# Altium integrated library TerminalBlocksPluggable_5.08mm.IntLib: 266 symbols (part 1 of 2) (continued)
## 691312510015
designator J?
WR-TBL Terminal Blocks Serie 312 – 5.08 mm; Manufacturer: Würth Elektronik eiSos GmbH; ComponentLink1 Description: Manufacturer; ComponentLink2 Description: Datasheet; NoPins: 15; Created Date: 31 March 2014; partNo: 691312510015; ComponentLink1URL: http://www.we-online.com; ComponentLink2URL: http://katalog.we-online.de/em/datasheet/6913125100xx.pdf; Created by: Karrer Zheng; Value: 691312510015
footprint 691312510015 (5,08mm - PCB Headers - Horizontal - Opened ends - 15p)
pins: 1, 2, 3, 4, 5, 6, 7, 8, 9, 10, 11, 12, 13, 14, 15

## 691312510016
designator J?
WR-TBL Terminal Blocks Serie 312 – 5.08 mm; Manufacturer: Würth Elektronik eiSos GmbH; ComponentLink1 Description: Manufacturer; ComponentLink2 Description: Datasheet; NoPins: 16; Created Date: 31 March 2014; partNo: 691312510016; ComponentLink1URL: http://www.we-online.com; ComponentLink2URL: http://katalog.we-online.de/em/datasheet/6913125100xx.pdf; Created by: Karrer Zheng; Value: 691312510016
footprint 691312510016 (5,08mm - PCB Headers - Horizontal - Opened ends - 16p)
pins: 1, 2, 3, 4, 5, 6, 7, 8, 9, 10, 11, 12, 13, 14, 15, 16

## 691312510017
designator J?
WR-TBL Terminal Blocks Serie 312 – 5.08 mm; Manufacturer: Würth Elektronik eiSos GmbH; ComponentLink1 Description: Manufacturer; ComponentLink2 Description: Datasheet; NoPins: 17; Created Date: 31 March 2014; partNo: 691312510017; ComponentLink1URL: http://www.we-online.com; ComponentLink2URL: http://katalog.we-online.de/em/datasheet/6913125100xx.pdf; Created by: Karrer Zheng; Value: 691312510017
footprint 691312510017 (5,08mm - PCB Headers - Horizontal - Opened ends - 17p)
pins: 1, 2, 3, 4, 5, 6, 7, 8, 9, 10, 11, 12, 13, 14, 15, 16, 17

## 691312510018
designator J?
WR-TBL Terminal Blocks Serie 312 – 5.08 mm; Manufacturer: Würth Elektronik eiSos GmbH; ComponentLink1 Description: Manufacturer; ComponentLink2 Description: Datasheet; NoPins: 18; Created Date: 31 March 2014; partNo: 691312510018; ComponentLink1URL: http://www.we-online.com; ComponentLink2URL: http://katalog.we-online.de/em/datasheet/6913125100xx.pdf; Created by: Karrer Zheng; Value: 691312510018
footprint 691312510018 (5,08mm - PCB Headers - Horizontal - Opened ends - 18p)
pins: 1, 2, 3, 4, 5, 6, 7, 8, 9, 10, 11, 12, 13, 14, 15, 16, 17, 18

## 691312510019
designator J?
WR-TBL Terminal Blocks Serie 312 – 5.08 mm; Manufacturer: Würth Elektronik eiSos GmbH; ComponentLink1 Description: Manufacturer; ComponentLink2 Description: Datasheet; NoPins: 19; Created Date: 31 March 2014; partNo: 691312510019; ComponentLink1URL: http://www.we-online.com; ComponentLink2URL: http://katalog.we-online.de/em/datasheet/6913125100xx.pdf; Created by: Karrer Zheng; Value: 691312510019
footprint 691312510019 (5,08mm - PCB Headers - Horizontal - Opened ends - 19p)
pins: 1, 2, 3, 4, 5, 6, 7, 8, 9, 10, 11, 12, 13, 14, 15, 16, 17, 18, 19

## 691312510020
designator J?
WR-TBL Terminal Blocks Serie 312 – 5.08 mm; Manufacturer: Würth Elektronik eiSos GmbH; ComponentLink1 Description: Manufacturer; ComponentLink2 Description: Datasheet; NoPins: 20; Created Date: 31 March 2014; partNo: 691312510020; ComponentLink1URL: http://www.we-online.com; ComponentLink2URL: http://katalog.we-online.de/em/datasheet/6913125100xx.pdf; Created by: Karrer Zheng; Value: 691312510020
footprint 691312510020 (5,08mm - PCB Headers - Horizontal - Opened ends - 20p)
pins: 1, 2, 3, 4, 5, 6, 7, 8, 9, 10, 11, 12, 13, 14, 15, 16, 17, 18, 19, 20

## 691312510021
designator J?
WR-TBL Terminal Blocks Serie 312 – 5.08 mm; Manufacturer: Würth Elektronik eiSos GmbH; ComponentLink1 Description: Manufacturer; ComponentLink2 Description: Datasheet; NoPins: 21; Created Date: 31 March 2014; partNo: 691312510021; ComponentLink1URL: http://www.we-online.com; ComponentLink2URL: http://katalog.we-online.de/em/datasheet/6913125100xx.pdf; Created by: Karrer Zheng; Value: 691312510021
footprint 691312510021 (5,08mm - PCB Headers - Horizontal - Opened ends - 21p)
pins: 1, 2, 3, 4, 5, 6, 7, 8, 9, 10, 11, 12, 13, 14, 15, 16, 17, 18, 19, 20, 21

## 691312510022
designator J?
WR-TBL Terminal Blocks Serie 312 – 5.08 mm; Manufacturer: Würth Elektronik eiSos GmbH; ComponentLink1 Description: Manufacturer; ComponentLink2 Description: Datasheet; NoPins: 22; Created Date: 31 March 2014; partNo: 691312510022; ComponentLink1URL: http://www.we-online.com; ComponentLink2URL: http://katalog.we-online.de/em/datasheet/6913125100xx.pdf; Created by: Karrer Zheng; Value: 691312510022
footprint 691312510022 (5,08mm - PCB Headers - Horizontal - Opened ends - 22p)
pins: 1, 2, 3, 4, 5, 6, 7, 8, 9, 10, 11, 12, 13, 14, 15, 16, 17, 18, 19, 20, 21, 22

## 691312510023
designator J?
WR-TBL Terminal Blocks Serie 312 – 5.08 mm; Manufacturer: Würth Elektronik eiSos GmbH; ComponentLink1 Description: Manufacturer; ComponentLink2 Description: Datasheet; NoPins: 23; Created Date: 31 March 2014; partNo: 691312510023; ComponentLink1URL: http://www.we-online.com; ComponentLink2URL: http://katalog.we-online.de/em/datasheet/6913125100xx.pdf; Created by: Karrer Zheng; Value: 691312510023
footprint 691312510023 (5,08mm - PCB Headers - Horizontal - Opened ends - 23p)
pins: 1, 2, 3, 4, 5, 6, 7, 8, 9, 10, 11, 12, 13, 14, 15, 16, 17, 18, 19, 20, 21, 22, 23

## 691312510024
designator J?
WR-TBL Terminal Blocks Serie 312 – 5.08 mm; Manufacturer: Würth Elektronik eiSos GmbH; ComponentLink1 Description: Manufacturer; ComponentLink2 Description: Datasheet; NoPins: 24; Created Date: 31 March 2014; partNo: 691312510024; ComponentLink1URL: http://www.we-online.com; ComponentLink2URL: http://katalog.we-online.de/em/datasheet/6913125100xx.pdf; Created by: Karrer Zheng; Value: 691312510024
footprint 691312510024 (5,08mm - PCB Headers - Horizontal - Opened ends - 24p)
pins: 1, 2, 3, 4, 5, 6, 7, 8, 9, 10, 11, 12, 13, 14, 15, 16, 17, 18, 19, 20, 21, 22, 23, 24


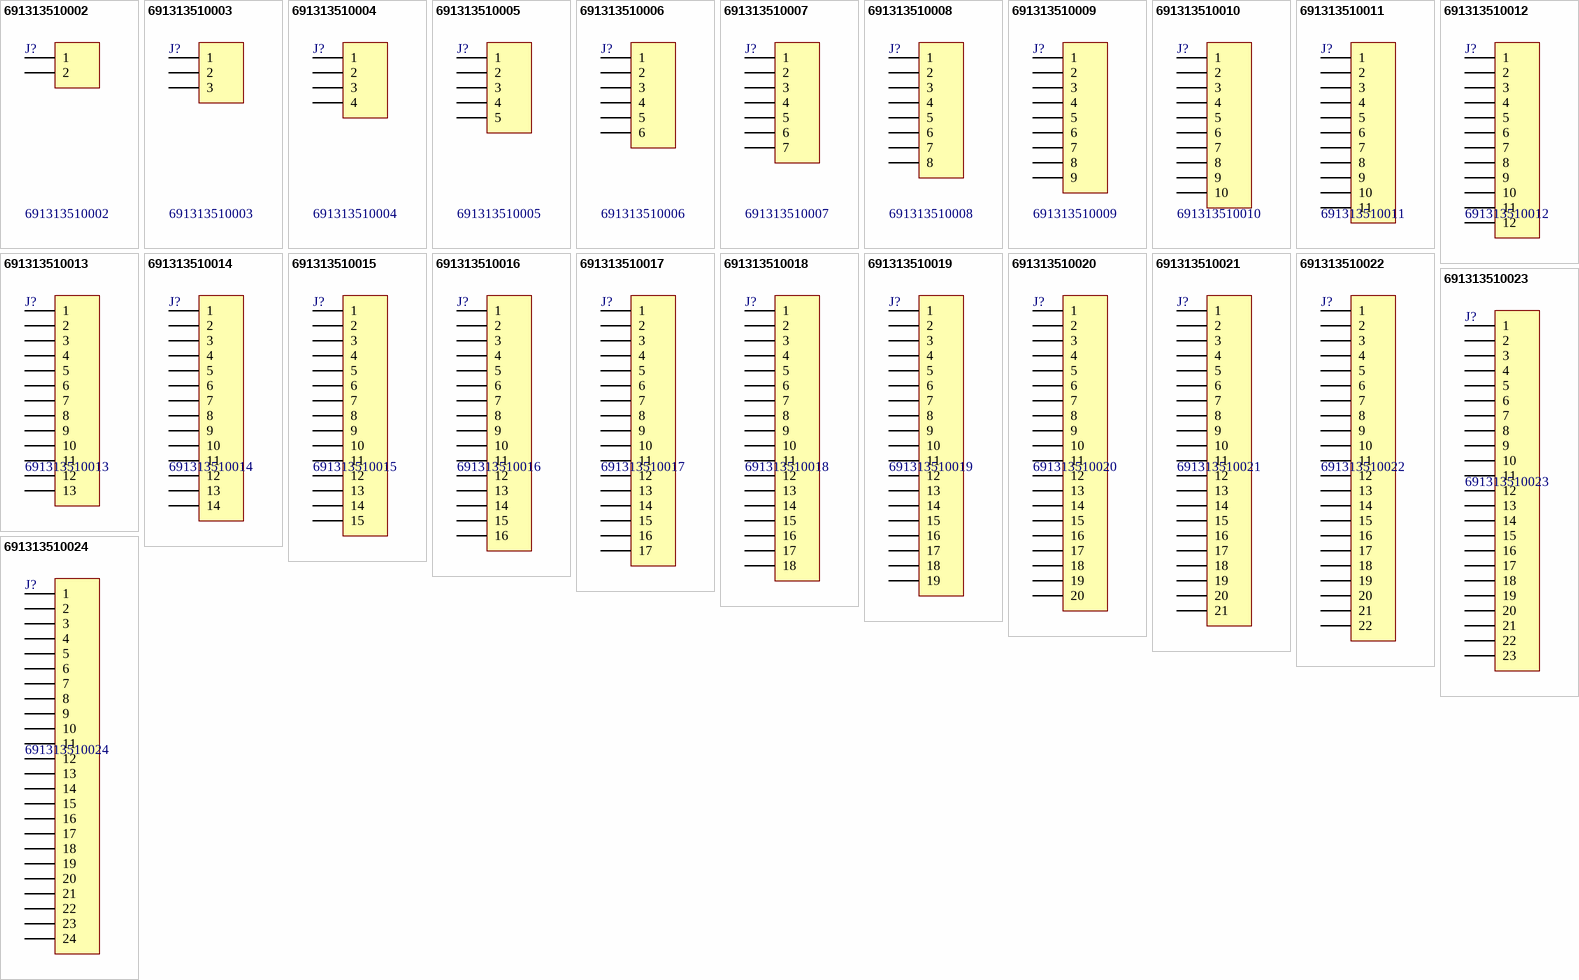
[diagram p5: symbols 691313510002 to 691313510024]

## 691313510002
designator J?
WR-TBL Terminal Blocks Serie 313 – 5.08 mm; Manufacturer: Würth Elektronik eiSos GmbH; ComponentLink1 Description: Manufacturer; ComponentLink2 Description: Datasheet; NoPins: 02; Created Date: 31 March 2014; partNo: 691313510002; ComponentLink1URL: http://www.we-online.com; ComponentLink2URL: http://katalog.we-online.de/em/datasheet/6913135100xx.pdf; Created by: Karrer Zheng; Value: 691313510002
footprint 691313510002 (5,08mm - PCB Headers - Horizontal - Closed ends - 02p)
pins: 1, 2

## 691313510003
designator J?
WR-TBL Terminal Blocks Serie 313 – 5.08 mm; Manufacturer: Würth Elektronik eiSos GmbH; ComponentLink1 Description: Manufacturer; ComponentLink2 Description: Datasheet; NoPins: 03; Created Date: 31 March 2014; partNo: 691313510003; ComponentLink1URL: http://www.we-online.com; ComponentLink2URL: http://katalog.we-online.de/em/datasheet/6913135100xx.pdf; Created by: Karrer Zheng; Value: 691313510003
footprint 691313510003 (5,08mm - PCB Headers - Horizontal - Closed ends - 03p)
pins: 1, 2, 3

## 691313510004
designator J?
WR-TBL Terminal Blocks Serie 313 – 5.08 mm; Manufacturer: Würth Elektronik eiSos GmbH; ComponentLink1 Description: Manufacturer; ComponentLink2 Description: Datasheet; NoPins: 04; Created Date: 31 March 2014; partNo: 691313510004; ComponentLink1URL: http://www.we-online.com; ComponentLink2URL: http://katalog.we-online.de/em/datasheet/6913135100xx.pdf; Created by: Karrer Zheng; Value: 691313510004
footprint 691313510004 (5,08mm - PCB Headers - Horizontal - Closed ends - 04p)
pins: 1, 2, 3, 4

## 691313510005
designator J?
WR-TBL Terminal Blocks Serie 313 – 5.08 mm; Manufacturer: Würth Elektronik eiSos GmbH; ComponentLink1 Description: Manufacturer; ComponentLink2 Description: Datasheet; NoPins: 05; Created Date: 31 March 2014; partNo: 691313510005; ComponentLink1URL: http://www.we-online.com; ComponentLink2URL: http://katalog.we-online.de/em/datasheet/6913135100xx.pdf; Created by: Karrer Zheng; Value: 691313510005
footprint 691313510005 (5,08mm - PCB Headers - Horizontal - Closed ends - 05p)
pins: 1, 2, 3, 4, 5

## 691313510006
designator J?
WR-TBL Terminal Blocks Serie 313 – 5.08 mm; Manufacturer: Würth Elektronik eiSos GmbH; ComponentLink1 Description: Manufacturer; ComponentLink2 Description: Datasheet; NoPins: 06; Created Date: 31 March 2014; partNo: 691313510006; ComponentLink1URL: http://www.we-online.com; ComponentLink2URL: http://katalog.we-online.de/em/datasheet/6913135100xx.pdf; Created by: Karrer Zheng; Value: 691313510006
footprint 691313510006 (5,08mm - PCB Headers - Horizontal - Closed ends - 06p)
pins: 1, 2, 3, 4, 5, 6

## 691313510007
designator J?
WR-TBL Terminal Blocks Serie 313 – 5.08 mm; Manufacturer: Würth Elektronik eiSos GmbH; ComponentLink1 Description: Manufacturer; ComponentLink2 Description: Datasheet; NoPins: 07; Created Date: 31 March 2014; partNo: 691313510007; ComponentLink1URL: http://www.we-online.com; ComponentLink2URL: http://katalog.we-online.de/em/datasheet/6913135100xx.pdf; Created by: Karrer Zheng; Value: 691313510007
footprint 691313510007 (5,08mm - PCB Headers - Horizontal - Closed ends - 07p)
pins: 1, 2, 3, 4, 5, 6, 7

## 691313510008
designator J?
WR-TBL Terminal Blocks Serie 313 – 5.08 mm; Manufacturer: Würth Elektronik eiSos GmbH; ComponentLink1 Description: Manufacturer; ComponentLink2 Description: Datasheet; NoPins: 08; Created Date: 31 March 2014; partNo: 691313510008; ComponentLink1URL: http://www.we-online.com; ComponentLink2URL: http://katalog.we-online.de/em/datasheet/6913135100xx.pdf; Created by: Karrer Zheng; Value: 691313510008
footprint 691313510008 (5,08mm - PCB Headers - Horizontal - Closed ends - 08p)
pins: 1, 2, 3, 4, 5, 6, 7, 8

## 691313510009
designator J?
WR-TBL Terminal Blocks Serie 313 – 5.08 mm; Manufacturer: Würth Elektronik eiSos GmbH; ComponentLink1 Description: Manufacturer; ComponentLink2 Description: Datasheet; NoPins: 09; Created Date: 31 March 2014; partNo: 691313510009; ComponentLink1URL: http://www.we-online.com; ComponentLink2URL: http://katalog.we-online.de/em/datasheet/6913135100xx.pdf; Created by: Karrer Zheng; Value: 691313510009
footprint 691313510009 (5,08mm - PCB Headers - Horizontal - Closed ends - 09p)
pins: 1, 2, 3, 4, 5, 6, 7, 8, 9

## 691313510010
designator J?
WR-TBL Terminal Blocks Serie 313 – 5.08 mm; Manufacturer: Würth Elektronik eiSos GmbH; ComponentLink1 Description: Manufacturer; ComponentLink2 Description: Datasheet; NoPins: 10; Created Date: 31 March 2014; partNo: 691313510010; ComponentLink1URL: http://www.we-online.com; ComponentLink2URL: http://katalog.we-online.de/em/datasheet/6913135100xx.pdf; Created by: Karrer Zheng; Value: 691313510010
footprint 691313510010 (5,08mm - PCB Headers - Horizontal - Closed ends - 10p)
pins: 1, 2, 3, 4, 5, 6, 7, 8, 9, 10

## 691313510011
designator J?
WR-TBL Terminal Blocks Serie 313 – 5.08 mm; Manufacturer: Würth Elektronik eiSos GmbH; ComponentLink1 Description: Manufacturer; ComponentLink2 Description: Datasheet; NoPins: 11; Created Date: 31 March 2014; partNo: 691313510011; ComponentLink1URL: http://www.we-online.com; ComponentLink2URL: http://katalog.we-online.de/em/datasheet/6913135100xx.pdf; Created by: Karrer Zheng; Value: 691313510011
footprint 691313510011 (5,08mm - PCB Headers - Horizontal - Closed ends - 11p)
pins: 1, 2, 3, 4, 5, 6, 7, 8, 9, 10, 11

## 691313510012
designator J?
WR-TBL Terminal Blocks Serie 313 – 5.08 mm; Manufacturer: Würth Elektronik eiSos GmbH; ComponentLink1 Description: Manufacturer; ComponentLink2 Description: Datasheet; NoPins: 12; Created Date: 31 March 2014; partNo: 691313510012; ComponentLink1URL: http://www.we-online.com; ComponentLink2URL: http://katalog.we-online.de/em/datasheet/6913135100xx.pdf; Created by: Karrer Zheng; Value: 691313510012
footprint 691313510012 (5,08mm - PCB Headers - Horizontal - Closed ends - 12p)
pins: 1, 2, 3, 4, 5, 6, 7, 8, 9, 10, 11, 12

## 691313510013
designator J?
WR-TBL Terminal Blocks Serie 313 – 5.08 mm; Manufacturer: Würth Elektronik eiSos GmbH; ComponentLink1 Description: Manufacturer; ComponentLink2 Description: Datasheet; NoPins: 13; Created Date: 31 March 2014; partNo: 691313510013; ComponentLink1URL: http://www.we-online.com; ComponentLink2URL: http://katalog.we-online.de/em/datasheet/6913135100xx.pdf; Created by: Karrer Zheng; Value: 691313510013
footprint 691313510013 (5,08mm - PCB Headers - Horizontal - Closed ends - 13p)
pins: 1, 2, 3, 4, 5, 6, 7, 8, 9, 10, 11, 12, 13

## 691313510014
designator J?
WR-TBL Terminal Blocks Serie 313 – 5.08 mm; Manufacturer: Würth Elektronik eiSos GmbH; ComponentLink1 Description: Manufacturer; ComponentLink2 Description: Datasheet; NoPins: 14; Created Date: 31 March 2014; partNo: 691313510014; ComponentLink1URL: http://www.we-online.com; ComponentLink2URL: http://katalog.we-online.de/em/datasheet/6913135100xx.pdf; Created by: Karrer Zheng; Value: 691313510014
footprint 691313510014 (5,08mm - PCB Headers - Horizontal - Closed ends - 14p)
pins: 1, 2, 3, 4, 5, 6, 7, 8, 9, 10, 11, 12, 13, 14

## 691313510015
designator J?
WR-TBL Terminal Blocks Serie 313 – 5.08 mm; Manufacturer: Würth Elektronik eiSos GmbH; ComponentLink1 Description: Manufacturer; ComponentLink2 Description: Datasheet; NoPins: 15; Created Date: 31 March 2014; partNo: 691313510015; ComponentLink1URL: http://www.we-online.com; ComponentLink2URL: http://katalog.we-online.de/em/datasheet/6913135100xx.pdf; Created by: Karrer Zheng; Value: 691313510015
footprint 691313510015 (5,08mm - PCB Headers - Horizontal - Closed ends - 15p)
pins: 1, 2, 3, 4, 5, 6, 7, 8, 9, 10, 11, 12, 13, 14, 15

## 691313510016
designator J?
WR-TBL Terminal Blocks Serie 313 – 5.08 mm; Manufacturer: Würth Elektronik eiSos GmbH; ComponentLink1 Description: Manufacturer; ComponentLink2 Description: Datasheet; NoPins: 16; Created Date: 31 March 2014; partNo: 691313510016; ComponentLink1URL: http://www.we-online.com; ComponentLink2URL: http://katalog.we-online.de/em/datasheet/6913135100xx.pdf; Created by: Karrer Zheng; Value: 691313510016
footprint 691313510016 (5,08mm - PCB Headers - Horizontal - Closed ends - 16p)
pins: 1, 2, 3, 4, 5, 6, 7, 8, 9, 10, 11, 12, 13, 14, 15, 16

## 691313510017
designator J?
WR-TBL Terminal Blocks Serie 313 – 5.08 mm; Manufacturer: Würth Elektronik eiSos GmbH; ComponentLink1 Description: Manufacturer; ComponentLink2 Description: Datasheet; NoPins: 17; Created Date: 31 March 2014; partNo: 691313510017; ComponentLink1URL: http://www.we-online.com; ComponentLink2URL: http://katalog.we-online.de/em/datasheet/6913135100xx.pdf; Created by: Karrer Zheng; Value: 691313510017
footprint 691313510017 (5,08mm - PCB Headers - Horizontal - Closed ends - 17p)
pins: 1, 2, 3, 4, 5, 6, 7, 8, 9, 10, 11, 12, 13, 14, 15, 16, 17

## 691313510018
designator J?
WR-TBL Terminal Blocks Serie 313 – 5.08 mm; Manufacturer: Würth Elektronik eiSos GmbH; ComponentLink1 Description: Manufacturer; ComponentLink2 Description: Datasheet; NoPins: 18; Created Date: 31 March 2014; partNo: 691313510018; ComponentLink1URL: http://www.we-online.com; ComponentLink2URL: http://katalog.we-online.de/em/datasheet/6913135100xx.pdf; Created by: Karrer Zheng; Value: 691313510018
footprint 691313510018 (5,08mm - PCB Headers - Horizontal - Closed ends - 18p)
pins: 1, 2, 3, 4, 5, 6, 7, 8, 9, 10, 11, 12, 13, 14, 15, 16, 17, 18

## 691313510019
designator J?
WR-TBL Terminal Blocks Serie 313 – 5.08 mm; Manufacturer: Würth Elektronik eiSos GmbH; ComponentLink1 Description: Manufacturer; ComponentLink2 Description: Datasheet; NoPins: 19; Created Date: 31 March 2014; partNo: 691313510019; ComponentLink1URL: http://www.we-online.com; ComponentLink2URL: http://katalog.we-online.de/em/datasheet/6913135100xx.pdf; Created by: Karrer Zheng; Value: 691313510019
footprint 691313510019 (5,08mm - PCB Headers - Horizontal - Closed ends - 19p)
pins: 1, 2, 3, 4, 5, 6, 7, 8, 9, 10, 11, 12, 13, 14, 15, 16, 17, 18, 19

## 691313510020
designator J?
WR-TBL Terminal Blocks Serie 313 – 5.08 mm; Manufacturer: Würth Elektronik eiSos GmbH; ComponentLink1 Description: Manufacturer; ComponentLink2 Description: Datasheet; NoPins: 20; Created Date: 31 March 2014; partNo: 691313510020; ComponentLink1URL: http://www.we-online.com; ComponentLink2URL: http://katalog.we-online.de/em/datasheet/6913135100xx.pdf; Created by: Karrer Zheng; Value: 691313510020
footprint 691313510020 (5,08mm - PCB Headers - Horizontal - Closed ends - 20p)
pins: 1, 2, 3, 4, 5, 6, 7, 8, 9, 10, 11, 12, 13, 14, 15, 16, 17, 18, 19, 20

## 691313510021
designator J?
WR-TBL Terminal Blocks Serie 313 – 5.08 mm; Manufacturer: Würth Elektronik eiSos GmbH; ComponentLink1 Description: Manufacturer; ComponentLink2 Description: Datasheet; NoPins: 21; Created Date: 31 March 2014; partNo: 691313510021; ComponentLink1URL: http://www.we-online.com; ComponentLink2URL: http://katalog.we-online.de/em/datasheet/6913135100xx.pdf; Created by: Karrer Zheng; Value: 691313510021
footprint 691313510021 (5,08mm - PCB Headers - Horizontal - Closed ends - 21p)
pins: 1, 2, 3, 4, 5, 6, 7, 8, 9, 10, 11, 12, 13, 14, 15, 16, 17, 18, 19, 20, 21

## 691313510022
designator J?
WR-TBL Terminal Blocks Serie 313 – 5.08 mm; Manufacturer: Würth Elektronik eiSos GmbH; ComponentLink1 Description: Manufacturer; ComponentLink2 Description: Datasheet; NoPins: 22; Created Date: 31 March 2014; partNo: 691313510022; ComponentLink1URL: http://www.we-online.com; ComponentLink2URL: http://katalog.we-online.de/em/datasheet/6913135100xx.pdf; Created by: Karrer Zheng; Value: 691313510022
footprint 691313510022 (5,08mm - PCB Headers - Horizontal - Closed ends - 22p)
pins: 1, 2, 3, 4, 5, 6, 7, 8, 9, 10, 11, 12, 13, 14, 15, 16, 17, 18, 19, 20, 21, 22

## 691313510023
designator J?
WR-TBL Terminal Blocks Serie 313 – 5.08 mm; Manufacturer: Würth Elektronik eiSos GmbH; ComponentLink1 Description: Manufacturer; ComponentLink2 Description: Datasheet; NoPins: 23; Created Date: 31 March 2014; partNo: 691313510023; ComponentLink1URL: http://www.we-online.com; ComponentLink2URL: http://katalog.we-online.de/em/datasheet/6913135100xx.pdf; Created by: Karrer Zheng; Value: 691313510023
footprint 691313510023 (5,08mm - PCB Headers - Horizontal - Closed ends -23p)
pins: 1, 2, 3, 4, 5, 6, 7, 8, 9, 10, 11, 12, 13, 14, 15, 16, 17, 18, 19, 20, 21, 22, 23

## 691313510024
designator J?
WR-TBL Terminal Blocks Serie 313 – 5.08 mm; Manufacturer: Würth Elektronik eiSos GmbH; ComponentLink1 Description: Manufacturer; ComponentLink2 Description: Datasheet; NoPins: 24; Created Date: 31 March 2014; partNo: 691313510024; ComponentLink1URL: http://www.we-online.com; ComponentLink2URL: http://katalog.we-online.de/em/datasheet/6913135100xx.pdf; Created by: Karrer Zheng; Value: 691313510024
footprint 691313510024 (5,08mm - PCB Headers - Horizontal - Closed ends - 24p)
pins: 1, 2, 3, 4, 5, 6, 7, 8, 9, 10, 11, 12, 13, 14, 15, 16, 17, 18, 19, 20, 21, 22, 23, 24


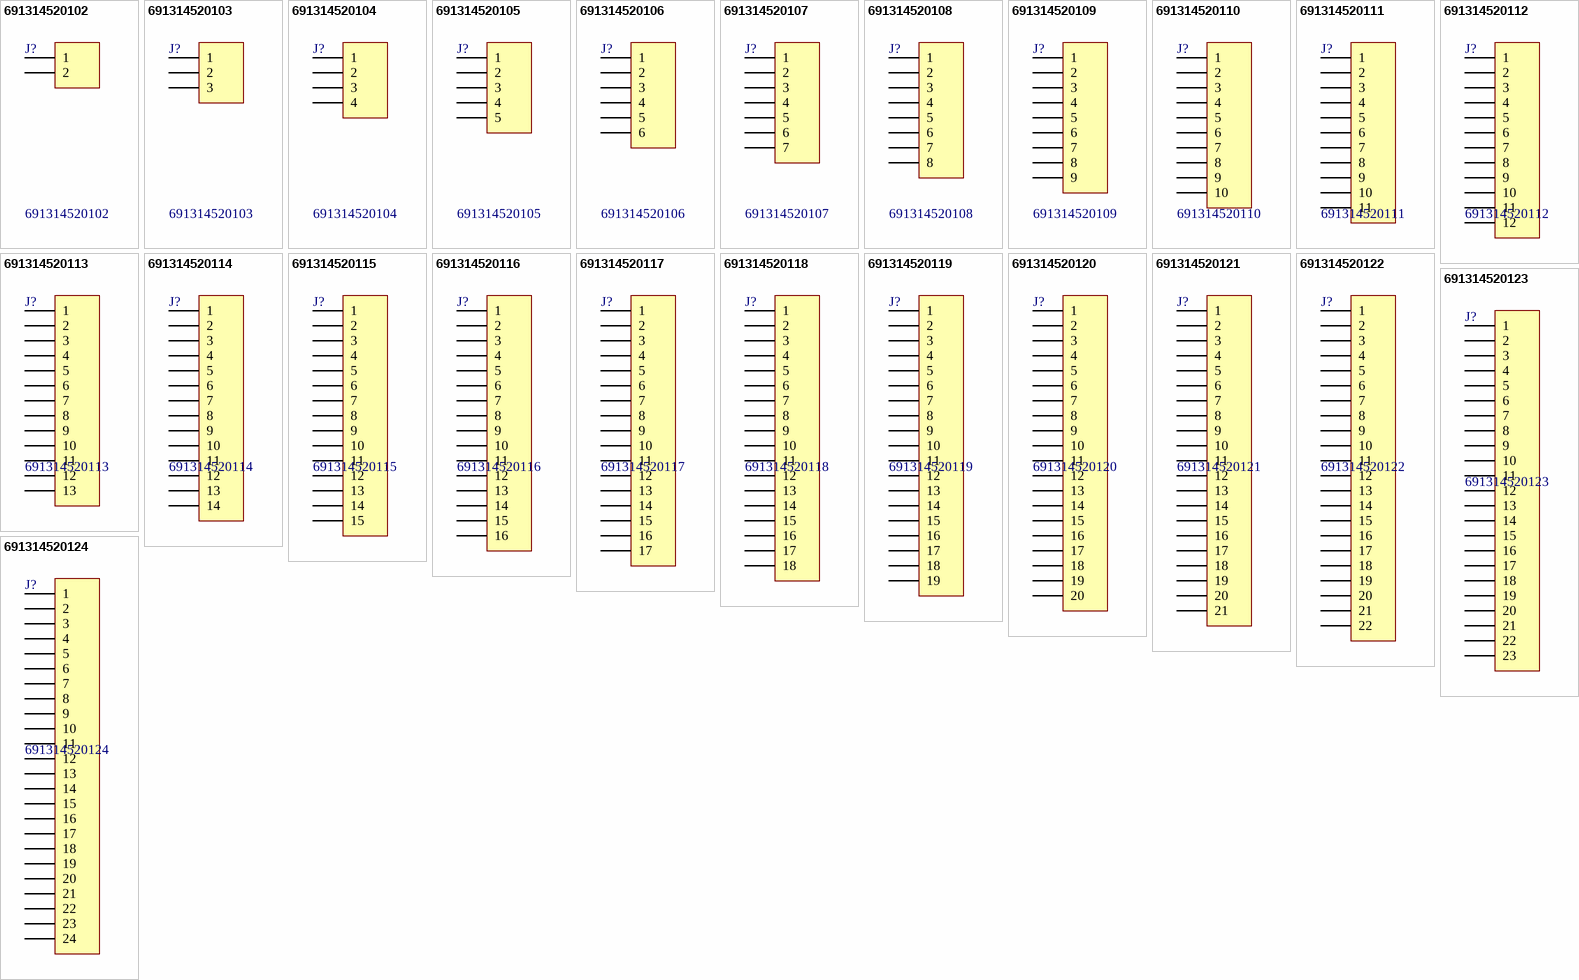
[diagram p6: symbols 691314520102 to 691314520124]

## 691314520102
designator J?
WR-TBL Terminal Blocks Serie 314 – 5.08 mm; Manufacturer: Würth Elektronik eiSos GmbH; ComponentLink1 Description: Manufacturer; ComponentLink2 Description: Datasheet; NoPins: 02; Created Date: 09 April 2014; partNo: 691314520102; ComponentLink1URL: http://www.we-online.com; ComponentLink2URL: http://katalog.we-online.de/em/datasheet/6913145201xx.pdf; Created by: Karrer Zheng; Value: 691314520102
footprint 691314520102 (5,08mm - PCB Headers - 45°- 02p)
pins: 1, 2

## 691314520103
designator J?
WR-TBL Terminal Blocks Serie 314 – 5.08 mm; Manufacturer: Würth Elektronik eiSos GmbH; ComponentLink1 Description: Manufacturer; ComponentLink2 Description: Datasheet; NoPins: 03; Created Date: 09 April 2014; partNo: 691314520103; ComponentLink1URL: http://www.we-online.com; ComponentLink2URL: http://katalog.we-online.de/em/datasheet/6913145201xx.pdf; Created by: Karrer Zheng; Value: 691314520103
footprint 691314520103 (5,08mm - PCB Headers - 45°- 03p)
pins: 1, 2, 3

## 691314520104
designator J?
WR-TBL Terminal Blocks Serie 314 – 5.08 mm; Manufacturer: Würth Elektronik eiSos GmbH; ComponentLink1 Description: Manufacturer; ComponentLink2 Description: Datasheet; NoPins: 04; Created Date: 09 April 2014; partNo: 691314520104; ComponentLink1URL: http://www.we-online.com; ComponentLink2URL: http://katalog.we-online.de/em/datasheet/6913145201xx.pdf; Created by: Karrer Zheng; Value: 691314520104
footprint 691314520104 (5,08mm - PCB Headers - 45°- 04p)
pins: 1, 2, 3, 4

## 691314520105
designator J?
WR-TBL Terminal Blocks Serie 314 – 5.08 mm; Manufacturer: Würth Elektronik eiSos GmbH; ComponentLink1 Description: Manufacturer; ComponentLink2 Description: Datasheet; NoPins: 05; Created Date: 09 April 2014; partNo: 691314520105; ComponentLink1URL: http://www.we-online.com; ComponentLink2URL: http://katalog.we-online.de/em/datasheet/6913145201xx.pdf; Created by: Karrer Zheng; Value: 691314520105
footprint 691314520105 (5,08mm - PCB Headers - 45°- 05p)
pins: 1, 2, 3, 4, 5

## 691314520106
designator J?
WR-TBL Terminal Blocks Serie 314 – 5.08 mm; Manufacturer: Würth Elektronik eiSos GmbH; ComponentLink1 Description: Manufacturer; ComponentLink2 Description: Datasheet; NoPins: 06; Created Date: 09 April 2014; partNo: 691314520106; ComponentLink1URL: http://www.we-online.com; ComponentLink2URL: http://katalog.we-online.de/em/datasheet/6913145201xx.pdf; Created by: Karrer Zheng; Value: 691314520106
footprint 691314520106 (5,08mm - PCB Headers - 45°- 06p)
pins: 1, 2, 3, 4, 5, 6

## 691314520107
designator J?
WR-TBL Terminal Blocks Serie 314 – 5.08 mm; Manufacturer: Würth Elektronik eiSos GmbH; ComponentLink1 Description: Manufacturer; ComponentLink2 Description: Datasheet; NoPins: 07; Created Date: 09 April 2014; partNo: 691314520107; ComponentLink1URL: http://www.we-online.com; ComponentLink2URL: http://katalog.we-online.de/em/datasheet/6913145201xx.pdf; Created by: Karrer Zheng; Value: 691314520107
footprint 691314520107 (5,08mm - PCB Headers - 45°- 07p)
pins: 1, 2, 3, 4, 5, 6, 7

## 691314520108
designator J?
WR-TBL Terminal Blocks Serie 314 – 5.08 mm; Manufacturer: Würth Elektronik eiSos GmbH; ComponentLink1 Description: Manufacturer; ComponentLink2 Description: Datasheet; NoPins: 08; Created Date: 09 April 2014; partNo: 691314520108; ComponentLink1URL: http://www.we-online.com; ComponentLink2URL: http://katalog.we-online.de/em/datasheet/6913145201xx.pdf; Created by: Karrer Zheng; Value: 691314520108
footprint 691314520108 (5,08mm - PCB Headers - 45°- 08p)
pins: 1, 2, 3, 4, 5, 6, 7, 8

## 691314520109
designator J?
WR-TBL Terminal Blocks Serie 314 – 5.08 mm; Manufacturer: Würth Elektronik eiSos GmbH; ComponentLink1 Description: Manufacturer; ComponentLink2 Description: Datasheet; NoPins: 09; Created Date: 09 April 2014; partNo: 691314520109; ComponentLink1URL: http://www.we-online.com; ComponentLink2URL: http://katalog.we-online.de/em/datasheet/6913145201xx.pdf; Created by: Karrer Zheng; Value: 691314520109
footprint 691314520109 (5,08mm - PCB Headers - 45°- 09p)
pins: 1, 2, 3, 4, 5, 6, 7, 8, 9

## 691314520110
designator J?
WR-TBL Terminal Blocks Serie 314 – 5.08 mm; Manufacturer: Würth Elektronik eiSos GmbH; ComponentLink1 Description: Manufacturer; ComponentLink2 Description: Datasheet; NoPins: 10; Created Date: 09 April 2014; partNo: 691314520110; ComponentLink1URL: http://www.we-online.com; ComponentLink2URL: http://katalog.we-online.de/em/datasheet/6913145201xx.pdf; Created by: Karrer Zheng; Value: 691314520110
footprint 691314520110 (5,08mm - PCB Headers - 45°- 10p)
pins: 1, 2, 3, 4, 5, 6, 7, 8, 9, 10

## 691314520111
designator J?
WR-TBL Terminal Blocks Serie 314 – 5.08 mm; Manufacturer: Würth Elektronik eiSos GmbH; ComponentLink1 Description: Manufacturer; ComponentLink2 Description: Datasheet; NoPins: 11; Created Date: 09 April 2014; partNo: 691314520111; ComponentLink1URL: http://www.we-online.com; ComponentLink2URL: http://katalog.we-online.de/em/datasheet/6913145201xx.pdf; Created by: Karrer Zheng; Value: 691314520111
footprint 691314520111 (5,08mm - PCB Headers - 45°- 11p)
pins: 1, 2, 3, 4, 5, 6, 7, 8, 9, 10, 11

## 691314520112
designator J?
WR-TBL Terminal Blocks Serie 314 – 5.08 mm; Manufacturer: Würth Elektronik eiSos GmbH; ComponentLink1 Description: Manufacturer; ComponentLink2 Description: Datasheet; NoPins: 12; Created Date: 09 April 2014; partNo: 691314520112; ComponentLink1URL: http://www.we-online.com; ComponentLink2URL: http://katalog.we-online.de/em/datasheet/6913145201xx.pdf; Created by: Karrer Zheng; Value: 691314520112
footprint 691314520112 (5,08mm - PCB Headers - 45°- 12p)
pins: 1, 2, 3, 4, 5, 6, 7, 8, 9, 10, 11, 12

## 691314520113
designator J?
WR-TBL Terminal Blocks Serie 314 – 5.08 mm; Manufacturer: Würth Elektronik eiSos GmbH; ComponentLink1 Description: Manufacturer; ComponentLink2 Description: Datasheet; NoPins: 13; Created Date: 09 April 2014; partNo: 691314520113; ComponentLink1URL: http://www.we-online.com; ComponentLink2URL: http://katalog.we-online.de/em/datasheet/6913145201xx.pdf; Created by: Karrer Zheng; Value: 691314520113
footprint 691314520113 (5,08mm - PCB Headers - 45°- 13p)
pins: 1, 2, 3, 4, 5, 6, 7, 8, 9, 10, 11, 12, 13

## 691314520114
designator J?
WR-TBL Terminal Blocks Serie 314 – 5.08 mm; Manufacturer: Würth Elektronik eiSos GmbH; ComponentLink1 Description: Manufacturer; ComponentLink2 Description: Datasheet; NoPins: 14; Created Date: 09 April 2014; partNo: 691314520114; ComponentLink1URL: http://www.we-online.com; ComponentLink2URL: http://katalog.we-online.de/em/datasheet/6913145201xx.pdf; Created by: Karrer Zheng; Value: 691314520114
footprint 691314520114 (5,08mm - PCB Headers - 45°- 14p)
pins: 1, 2, 3, 4, 5, 6, 7, 8, 9, 10, 11, 12, 13, 14

## 691314520115
designator J?
WR-TBL Terminal Blocks Serie 314 – 5.08 mm; Manufacturer: Würth Elektronik eiSos GmbH; ComponentLink1 Description: Manufacturer; ComponentLink2 Description: Datasheet; NoPins: 15; Created Date: 09 April 2014; partNo: 691314520115; ComponentLink1URL: http://www.we-online.com; ComponentLink2URL: http://katalog.we-online.de/em/datasheet/6913145201xx.pdf; Created by: Karrer Zheng; Value: 691314520115
footprint 691314520115 (5,08mm - PCB Headers - 45°- 15p)
pins: 1, 2, 3, 4, 5, 6, 7, 8, 9, 10, 11, 12, 13, 14, 15

## 691314520116
designator J?
WR-TBL Terminal Blocks Serie 314 – 5.08 mm; Manufacturer: Würth Elektronik eiSos GmbH; ComponentLink1 Description: Manufacturer; ComponentLink2 Description: Datasheet; NoPins: 16; Created Date: 09 April 2014; partNo: 691314520116; ComponentLink1URL: http://www.we-online.com; ComponentLink2URL: http://katalog.we-online.de/em/datasheet/6913145201xx.pdf; Created by: Karrer Zheng; Value: 691314520116
footprint 691314520116 (5,08mm - PCB Headers - 45°- 16p)
pins: 1, 2, 3, 4, 5, 6, 7, 8, 9, 10, 11, 12, 13, 14, 15, 16

## 691314520117
designator J?
WR-TBL Terminal Blocks Serie 314 – 5.08 mm; Manufacturer: Würth Elektronik eiSos GmbH; ComponentLink1 Description: Manufacturer; ComponentLink2 Description: Datasheet; NoPins: 17; Created Date: 09 April 2014; partNo: 691314520117; ComponentLink1URL: http://www.we-online.com; ComponentLink2URL: http://katalog.we-online.de/em/datasheet/6913145201xx.pdf; Created by: Karrer Zheng; Value: 691314520117
footprint 691314520117 (5,08mm - PCB Headers - 45°- 17p)
pins: 1, 2, 3, 4, 5, 6, 7, 8, 9, 10, 11, 12, 13, 14, 15, 16, 17

## 691314520118
designator J?
WR-TBL Terminal Blocks Serie 314 – 5.08 mm; Manufacturer: Würth Elektronik eiSos GmbH; ComponentLink1 Description: Manufacturer; ComponentLink2 Description: Datasheet; NoPins: 18; Created Date: 09 April 2014; partNo: 691314520118; ComponentLink1URL: http://www.we-online.com; ComponentLink2URL: http://katalog.we-online.de/em/datasheet/6913145201xx.pdf; Created by: Karrer Zheng; Value: 691314520118
footprint 691314520118 (5,08mm - PCB Headers - 45°- 18p)
pins: 1, 2, 3, 4, 5, 6, 7, 8, 9, 10, 11, 12, 13, 14, 15, 16, 17, 18

## 691314520119
designator J?
WR-TBL Terminal Blocks Serie 314 – 5.08 mm; Manufacturer: Würth Elektronik eiSos GmbH; ComponentLink1 Description: Manufacturer; ComponentLink2 Description: Datasheet; NoPins: 19; Created Date: 09 April 2014; partNo: 691314520119; ComponentLink1URL: http://www.we-online.com; ComponentLink2URL: http://katalog.we-online.de/em/datasheet/6913145201xx.pdf; Created by: Karrer Zheng; Value: 691314520119
footprint 691314520119 (5,08mm - PCB Headers - 45°- 19p)
pins: 1, 2, 3, 4, 5, 6, 7, 8, 9, 10, 11, 12, 13, 14, 15, 16, 17, 18, 19

## 691314520120
designator J?
WR-TBL Terminal Blocks Serie 314 – 5.08 mm; Manufacturer: Würth Elektronik eiSos GmbH; ComponentLink1 Description: Manufacturer; ComponentLink2 Description: Datasheet; NoPins: 20; Created Date: 09 April 2014; partNo: 691314520120; ComponentLink1URL: http://www.we-online.com; ComponentLink2URL: http://katalog.we-online.de/em/datasheet/6913145201xx.pdf; Created by: Karrer Zheng; Value: 691314520120
footprint 691314520120 (5,08mm - PCB Headers - 45°- 20p)
pins: 1, 2, 3, 4, 5, 6, 7, 8, 9, 10, 11, 12, 13, 14, 15, 16, 17, 18, 19, 20

## 691314520121
designator J?
WR-TBL Terminal Blocks Serie 314 – 5.08 mm; Manufacturer: Würth Elektronik eiSos GmbH; ComponentLink1 Description: Manufacturer; ComponentLink2 Description: Datasheet; NoPins: 21; Created Date: 09 April 2014; partNo: 691314520121; ComponentLink1URL: http://www.we-online.com; ComponentLink2URL: http://katalog.we-online.de/em/datasheet/6913145201xx.pdf; Created by: Karrer Zheng; Value: 691314520121
footprint 691314520121 (5,08mm - PCB Headers - 45°- 21p)
pins: 1, 2, 3, 4, 5, 6, 7, 8, 9, 10, 11, 12, 13, 14, 15, 16, 17, 18, 19, 20, 21

## 691314520122
designator J?
WR-TBL Terminal Blocks Serie 314 – 5.08 mm; Manufacturer: Würth Elektronik eiSos GmbH; ComponentLink1 Description: Manufacturer; ComponentLink2 Description: Datasheet; NoPins: 22; Created Date: 09 April 2014; partNo: 691314520122; ComponentLink1URL: http://www.we-online.com; ComponentLink2URL: http://katalog.we-online.de/em/datasheet/6913145201xx.pdf; Created by: Karrer Zheng; Value: 691314520122
footprint 691314520122 (5,08mm - PCB Headers - 45°- 22p)
pins: 1, 2, 3, 4, 5, 6, 7, 8, 9, 10, 11, 12, 13, 14, 15, 16, 17, 18, 19, 20, 21, 22

## 691314520123
designator J?
WR-TBL Terminal Blocks Serie 314 – 5.08 mm; Manufacturer: Würth Elektronik eiSos GmbH; ComponentLink1 Description: Manufacturer; ComponentLink2 Description: Datasheet; NoPins: 23; Created Date: 09 April 2014; partNo: 691314520123; ComponentLink1URL: http://www.we-online.com; ComponentLink2URL: http://katalog.we-online.de/em/datasheet/6913145201xx.pdf; Created by: Karrer Zheng; Value: 691314520123
footprint 691314520123 (5,08mm - PCB Headers - 45°- 23p)
pins: 1, 2, 3, 4, 5, 6, 7, 8, 9, 10, 11, 12, 13, 14, 15, 16, 17, 18, 19, 20, 21, 22, 23

## 691314520124
designator J?
WR-TBL Terminal Blocks Serie 314 – 5.08 mm; Manufacturer: Würth Elektronik eiSos GmbH; ComponentLink1 Description: Manufacturer; ComponentLink2 Description: Datasheet; NoPins: 24; Created Date: 09 April 2014; partNo: 691314520124; ComponentLink1URL: http://www.we-online.com; ComponentLink2URL: http://katalog.we-online.de/em/datasheet/6913145201xx.pdf; Created by: Karrer Zheng; Value: 691314520124
footprint 691314520124 (5,08mm - PCB Headers - 45°- 24p)
pins: 1, 2, 3, 4, 5, 6, 7, 8, 9, 10, 11, 12, 13, 14, 15, 16, 17, 18, 19, 20, 21, 22, 23, 24


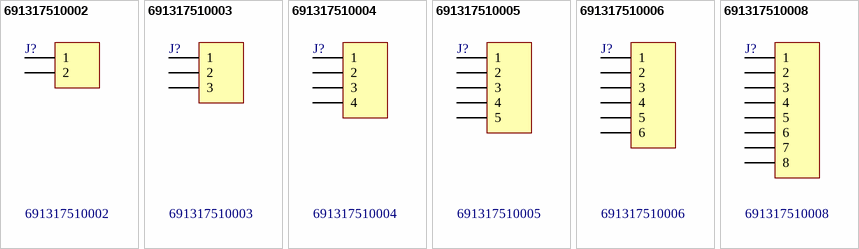
[diagram p7: symbols 691317510002 to 691317510008]

## 691317510002
designator J?
WR-TBL Terminal Blocks Serie 3175 - 5.08 mm  with Flanges; Manufacturer: Würth Elektronik eiSos GmbH; ComponentLink1 Description: Manufacturer; ComponentLink2 Description: Datasheet; NoPins: 02; Created Date: 09 April 2014; partNo: 691317510002; ComponentLink1URL: http://www.we-online.com; ComponentLink2URL: http://katalog.we-online.de/em/datasheet/6913175100xx.pdf; Created by: Karrer Zheng; Value: 691317510002
footprint 691317510002 (5,08mm - PCB Horizontal Closed With flanges - 02p)
pins: 1, 2

## 691317510003
designator J?
WR-TBL Terminal Blocks Serie 3175 - 5.08 mm  with Flanges; Manufacturer: Würth Elektronik eiSos GmbH; ComponentLink1 Description: Manufacturer; ComponentLink2 Description: Datasheet; NoPins: 03; Created Date: 09 April 2014; partNo: 691317510003; ComponentLink1URL: http://www.we-online.com; ComponentLink2URL: http://katalog.we-online.de/em/datasheet/6913175100xx.pdf; Created by: Karrer Zheng; Value: 691317510003
footprint 691317510003 (5,08mm - PCB Horizontal Closed With flanges - 03p)
pins: 1, 2, 3

## 691317510004
designator J?
WR-TBL Terminal Blocks Serie 3175 - 5.08 mm  with Flanges; Manufacturer: Würth Elektronik eiSos GmbH; ComponentLink1 Description: Manufacturer; ComponentLink2 Description: Datasheet; NoPins: 04; Created Date: 09 April 2014; partNo: 691317510004; ComponentLink1URL: http://www.we-online.com; ComponentLink2URL: http://katalog.we-online.de/em/datasheet/6913175100xx.pdf; Created by: Karrer Zheng; Value: 691317510004
footprint 691317510004 (5,08mm - PCB Horizontal Closed With flanges - 04p)
pins: 1, 2, 3, 4

## 691317510005
designator J?
WR-TBL Terminal Blocks Serie 3175 - 5.08 mm  with Flanges; Manufacturer: Würth Elektronik eiSos GmbH; ComponentLink1 Description: Manufacturer; ComponentLink2 Description: Datasheet; NoPins: 05; Created Date: 09 April 2014; partNo: 691317510005; ComponentLink1URL: http://www.we-online.com; ComponentLink2URL: http://katalog.we-online.de/em/datasheet/6913175100xx.pdf; Created by: Karrer Zheng; Value: 691317510005
footprint 691317510005 (5,08mm - PCB Horizontal Closed With flanges - 05p)
pins: 1, 2, 3, 4, 5

## 691317510006
designator J?
WR-TBL Terminal Blocks Serie 3175 - 5.08 mm  with Flanges; Manufacturer: Würth Elektronik eiSos GmbH; ComponentLink1 Description: Manufacturer; ComponentLink2 Description: Datasheet; NoPins: 06; Created Date: 09 April 2014; partNo: 691317510006; ComponentLink1URL: http://www.we-online.com; ComponentLink2URL: http://katalog.we-online.de/em/datasheet/6913175100xx.pdf; Created by: Karrer Zheng; Value: 691317510006
footprint 691317510006 (5,08mm - PCB Horizontal Closed With flanges - 06p)
pins: 1, 2, 3, 4, 5, 6

## 691317510008
designator J?
WR-TBL Terminal Blocks Serie 3175 - 5.08 mm  with Flanges; Manufacturer: Würth Elektronik eiSos GmbH; ComponentLink1 Description: Manufacturer; ComponentLink2 Description: Datasheet; NoPins: 08; Created Date: 09 April 2014; partNo: 691317510008; ComponentLink1URL: http://www.we-online.com; ComponentLink2URL: http://katalog.we-online.de/em/datasheet/6913175100xx.pdf; Created by: Karrer Zheng; Value: 691317510008
footprint 691317510008 (5,08mm - PCB Horizontal Closed With flanges - 08p)
pins: 1, 2, 3, 4, 5, 6, 7, 8


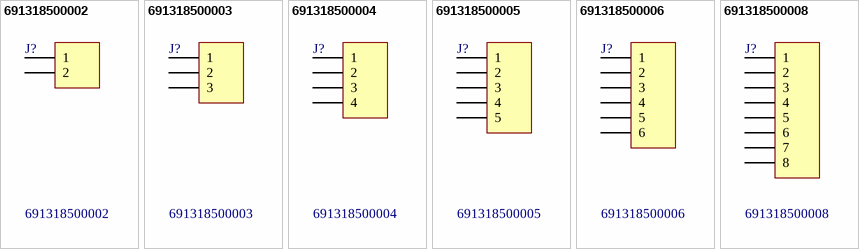
[diagram p8: symbols 691318500002 to 691318500008]

## 691318500002
designator J?
WR-TBL Terminal Blocks Serie 3185 - 5.08 mm with Flanges; Manufacturer: Würth Elektronik eiSos GmbH; ComponentLink1 Description: Manufacturer; ComponentLink2 Description: Datasheet; NoPins: 02; Created Date: 25 March 2014; partNo: 691318500002; ComponentLink1URL: http://www.we-online.com; ComponentLink2URL: http://katalog.we-online.de/em/datasheet/6913185000xx.pdf; Created by: Karrer Zheng; Value: 691318500002
footprint 691318500002
pins: 1, 2

## 691318500003
designator J?
WR-TBL Terminal Blocks Serie 3185 - 5.08 mm with Flanges; Manufacturer: Würth Elektronik eiSos GmbH; ComponentLink1 Description: Manufacturer; ComponentLink2 Description: Datasheet; NoPins: 03; Created Date: 25 March 2014; partNo: 691318500003; ComponentLink1URL: http://www.we-online.com; ComponentLink2URL: http://katalog.we-online.de/em/datasheet/6913185000xx.pdf; Created by: Karrer Zheng; Value: 691318500003
footprint 691318500003
pins: 1, 2, 3

## 691318500004
designator J?
WR-TBL Terminal Blocks Serie 3185 - 5.08 mm with Flanges; Manufacturer: Würth Elektronik eiSos GmbH; ComponentLink1 Description: Manufacturer; ComponentLink2 Description: Datasheet; NoPins: 04; Created Date: 25 March 2014; partNo: 691318500004; ComponentLink1URL: http://www.we-online.com; ComponentLink2URL: http://katalog.we-online.de/em/datasheet/6913185000xx.pdf; Created by: Karrer Zheng; Value: 691318500004
footprint 691318500004
pins: 1, 2, 3, 4

## 691318500005
designator J?
WR-TBL Terminal Blocks Serie 3185 - 5.08 mm with Flanges; Manufacturer: Würth Elektronik eiSos GmbH; ComponentLink1 Description: Manufacturer; ComponentLink2 Description: Datasheet; NoPins: 05; Created Date: 25 March 2014; partNo: 691318500005; ComponentLink1URL: http://www.we-online.com; ComponentLink2URL: http://katalog.we-online.de/em/datasheet/6913185000xx.pdf; Created by: Karrer Zheng; Value: 691318500005
footprint 691318500005
pins: 1, 2, 3, 4, 5

## 691318500006
designator J?
WR-TBL Terminal Blocks Serie 3185 - 5.08 mm with Flanges; Manufacturer: Würth Elektronik eiSos GmbH; ComponentLink1 Description: Manufacturer; ComponentLink2 Description: Datasheet; NoPins: 06; Created Date: 25 March 2014; partNo: 691318500006; ComponentLink1URL: http://www.we-online.com; ComponentLink2URL: http://katalog.we-online.de/em/datasheet/6913185000xx.pdf; Created by: Karrer Zheng; Value: 691318500006
footprint 691318500006
pins: 1, 2, 3, 4, 5, 6

## 691318500008
designator J?
WR-TBL Terminal Blocks Serie 3185 - 5.08 mm with Flanges; Manufacturer: Würth Elektronik eiSos GmbH; ComponentLink1 Description: Manufacturer; ComponentLink2 Description: Datasheet; NoPins: 08; Created Date: 25 March 2014; partNo: 691318500008; ComponentLink1URL: http://www.we-online.com; ComponentLink2URL: http://katalog.we-online.de/em/datasheet/6913185000xx.pdf; Created by: Karrer Zheng; Value: 691318500008
footprint 691318500008
pins: 1, 2, 3, 4, 5, 6, 7, 8


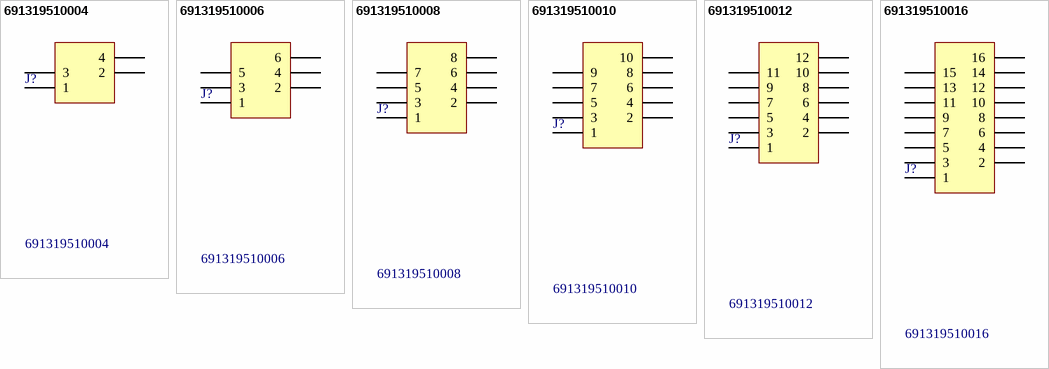
[diagram p9: symbols 691319510004 to 691319510016]

## 691319510004
designator J?
WR-TBL Terminal Blocks Serie 3195 - 5.08 mm; Manufacturer: Würth Elektronik eiSos GmbH; ComponentLink1 Description: Manufacturer; ComponentLink2 Description: Datasheet; NoPins: 04; Created Date: 31 March 2014; partNo: 691319510004; ComponentLink1URL: http://www.we-online.com; ComponentLink2URL: http://katalog.we-online.de/em/datasheet/6913195100xx.pdf; Created by: Karrer Zheng; Value: 691319510004
footprint 691319510004 (5,08mm - PCB - Dual row - Staggered - Horizontal - Closed - 04p)
pins: 1, 2, 3, 4

## 691319510006
designator J?
WR-TBL Terminal Blocks Serie 3195 - 5.08 mm; Manufacturer: Würth Elektronik eiSos GmbH; ComponentLink1 Description: Manufacturer; ComponentLink2 Description: Datasheet; NoPins: 06; Created Date: 31 March 2014; partNo: 691319510006; ComponentLink1URL: http://www.we-online.com; ComponentLink2URL: http://katalog.we-online.de/em/datasheet/6913195100xx.pdf; Created by: Karrer Zheng; Value: 691319510006
footprint 691319510006 (5,08mm - PCB - Dual row - Staggered - Horizontal - Closed - 06p)
pins: 1, 2, 3, 4, 5, 6

## 691319510008
designator J?
WR-TBL Terminal Blocks Serie 3195 - 5.08 mm; Manufacturer: Würth Elektronik eiSos GmbH; ComponentLink1 Description: Manufacturer; ComponentLink2 Description: Datasheet; NoPins: 08; Created Date: 31 March 2014; partNo: 691319510008; ComponentLink1URL: http://www.we-online.com; ComponentLink2URL: http://katalog.we-online.de/em/datasheet/6913195100xx.pdf; Created by: Karrer Zheng; Value: 691319510008
footprint 691319510008 (5,08mm - PCB - Dual row - Staggered - Horizontal - Closed - 08p)
pins: 1, 2, 3, 4, 5, 6, 7, 8

## 691319510010
designator J?
WR-TBL Terminal Blocks Serie 3195 - 5.08 mm; Manufacturer: Würth Elektronik eiSos GmbH; ComponentLink1 Description: Manufacturer; ComponentLink2 Description: Datasheet; NoPins: 10; Created Date: 31 March 2014; partNo: 691319510010; ComponentLink1URL: http://www.we-online.com; ComponentLink2URL: http://katalog.we-online.de/em/datasheet/6913195100xx.pdf; Created by: Karrer Zheng; Value: 691319510010
footprint 691319510010 (5,08mm - PCB - Dual row - Staggered - Horizontal - Closed - 10p)
pins: 1, 2, 3, 4, 5, 6, 7, 8, 9, 10

## 691319510012
designator J?
WR-TBL Terminal Blocks Serie 3195 - 5.08 mm; Manufacturer: Würth Elektronik eiSos GmbH; ComponentLink1 Description: Manufacturer; ComponentLink2 Description: Datasheet; NoPins: 12; Created Date: 31 March 2014; partNo: 691319510012; ComponentLink1URL: http://www.we-online.com; ComponentLink2URL: http://katalog.we-online.de/em/datasheet/6913195100xx.pdf; Created by: Karrer Zheng; Value: 691319510012
footprint 691319510012 (5,08mm - PCB - Dual row - Staggered - Horizontal - Closed - 12p)
pins: 1, 2, 3, 4, 5, 6, 7, 8, 9, 10, 11, 12

## 691319510016
designator J?
WR-TBL Terminal Blocks Serie 3195 - 5.08 mm; Manufacturer: Würth Elektronik eiSos GmbH; ComponentLink1 Description: Manufacturer; ComponentLink2 Description: Datasheet; NoPins: 16; Created Date: 31 March 2014; partNo: 691319510016; ComponentLink1URL: http://www.we-online.com; ComponentLink2URL: http://katalog.we-online.de/em/datasheet/6913195100xx.pdf; Created by: Karrer Zheng; Value: 691319510016
footprint 691319510016 (5,08mm - PCB - Dual row - Staggered - Horizontal - Closed - 16p)
pins: 1, 2, 3, 4, 5, 6, 7, 8, 9, 10, 11, 12, 13, 14, 15, 16


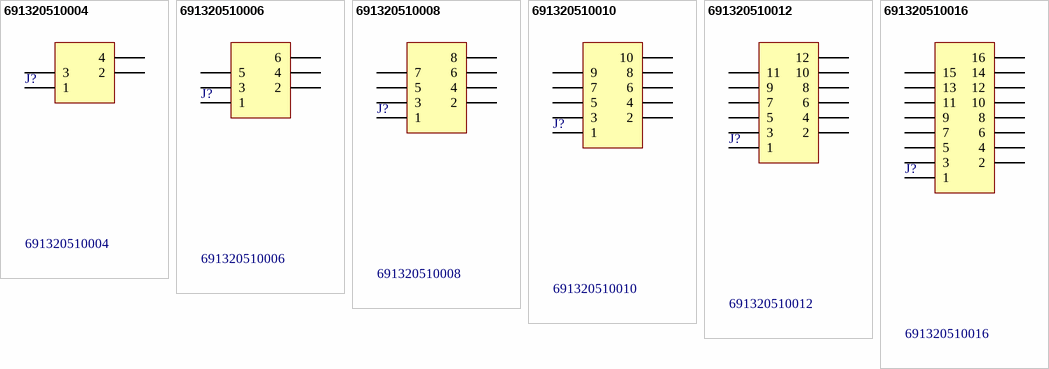
[diagram p10: symbols 691320510004 to 691320510016]

## 691320510004
designator J?
WR-TBL Terminal Blocks Serie 3205 - 5.08 mm with Flanges & Nut Type; Manufacturer: Würth Elektronik eiSos GmbH; ComponentLink1 Description: Manufacturer; ComponentLink2 Description: Datasheet; NoPins: 04; Created Date: 09 April 2014; partNo: 691320510004; ComponentLink1URL: http://www.we-online.com; ComponentLink2URL: http://katalog.we-online.de/em/datasheet/6913205100xx.pdf; Created by: Karrer Zheng; Value: 691320510004
footprint 691320510004 (5,08mm - PCB - Dual row - Staggered - Horizontal - Flanges - 04p)
pins: 1, 2, 3, 4

## 691320510006
designator J?
WR-TBL Terminal Blocks Serie 3205 - 5.08 mm with Flanges & Nut Type; Manufacturer: Würth Elektronik eiSos GmbH; ComponentLink1 Description: Manufacturer; ComponentLink2 Description: Datasheet; NoPins: 06; Created Date: 09 April 2014; partNo: 691320510006; ComponentLink1URL: http://www.we-online.com; ComponentLink2URL: http://katalog.we-online.de/em/datasheet/6913205100xx.pdf; Created by: Karrer Zheng; Value: 691320510006
footprint 691320510006 (5,08mm - PCB - Dual row - Staggered - Horizontal - Flanges - 06p)
pins: 1, 2, 3, 4, 5, 6

## 691320510008
designator J?
WR-TBL Terminal Blocks Serie 3205 - 5.08 mm with Flanges & Nut Type; Manufacturer: Würth Elektronik eiSos GmbH; ComponentLink1 Description: Manufacturer; ComponentLink2 Description: Datasheet; NoPins: 08; Created Date: 09 April 2014; partNo: 691320510008; ComponentLink1URL: http://www.we-online.com; ComponentLink2URL: http://katalog.we-online.de/em/datasheet/6913205100xx.pdf; Created by: Karrer Zheng; Value: 691320510008
footprint 691320510008 (5,08mm - PCB - Dual row - Staggered - Horizontal - Flanges - 08p)
pins: 1, 2, 3, 4, 5, 6, 7, 8

## 691320510010
designator J?
WR-TBL Terminal Blocks Serie 3205 - 5.08 mm with Flanges & Nut Type; Manufacturer: Würth Elektronik eiSos GmbH; ComponentLink1 Description: Manufacturer; ComponentLink2 Description: Datasheet; NoPins: 10; Created Date: 09 April 2014; partNo: 691320510010; ComponentLink1URL: http://www.we-online.com; ComponentLink2URL: http://katalog.we-online.de/em/datasheet/6913205100xx.pdf; Created by: Karrer Zheng; Value: 691320510010
footprint 691320510010 (5,08mm - PCB - Dual row - Staggered - Horizontal - Flanges - 10p)
pins: 1, 2, 3, 4, 5, 6, 7, 8, 9, 10